# Altium footprint library lamp_controller.PcbLib: 67 footprints (part 2 of 5)
Each footprint in its own frame and in the unit in brackets; x right, y up, seen from the top. Pads: shape width x height; smd on the part's side, far side on the other; paste and mask are expansions set on the pad; w line width, h text height; cw(c..) or ccw(c..) is an arc to the next point about the centre after c.
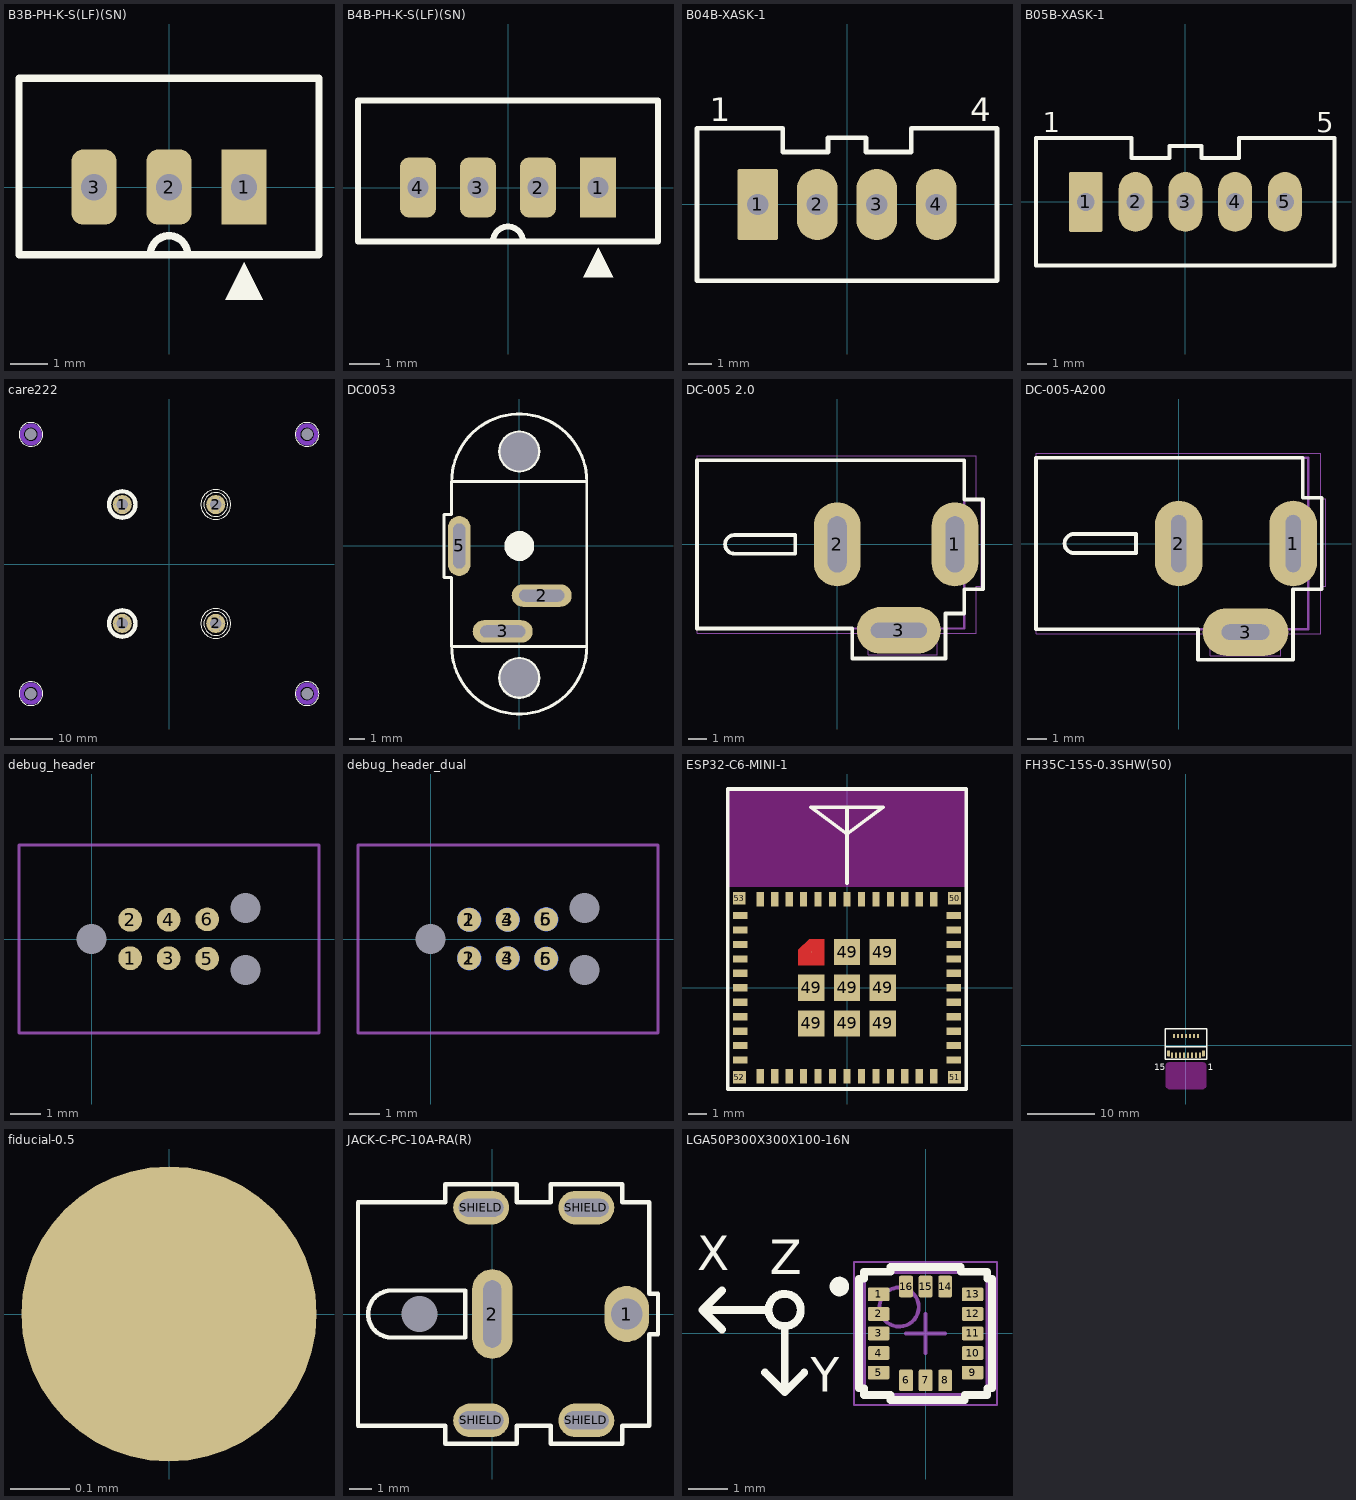
[diagram p1: the footprints below, top view; thin cyan lines are the x and y axes]

## B3B-PH-K-S(LF)(SN) [mm]
pads (3):
  rect 1.2x2 hole 0.7: 1(2,0)
  rrect50% 1.2x2 hole 0.7: 2(0,0) 3(-2,0)
Top Overlay:
  region: 1.5,-3 2.5,-3 2,-2
  lines w0.2: -0.5,-1.8 cw(c0,-1.8) 0.5,-1.8 ; -0.5,2.9 4,2.9 4,2.675 4,-1.575 4,-1.8 -4,-1.8 -4,2.9 0.5,2.9
3D body "B3B-PH-K--3DModel-STEP-56544.STEP": height 6, standoff -3.42, extent -3.975,-1.71 3.925,2.79

## B4B-PH-K-S(LF)(SN) [mm]
pads (4):
  rect 1.2x2 hole 0.7: 1(3,0)
  rrect50% 1.2x2 hole 0.7: 2(1,0) 3(-1,0) 4(-3,0)
Top Overlay:
  region: 2.5,-3 3.5,-3 3,-2
  lines w0.2: -0.5,-1.8 cw(c0,-1.8) 0.5,-1.8 ; -0.5,2.9 5,2.9 5,-1.8 -5,-1.8 -5,2.9 0.5,2.9
3D body "b4b-ph-k-s_connector.step": height 6.01, standoff -3.39, extent -4.95,-1.7 4.95,2.8

## B04B-XASK-1 [mm] "JST XA 2.5mm header"
pads (4):
  rrect10% 1.7x3 hole 0.9: 1(-3.75,0)
  oval 1.7x3 hole 0.9: 2(-1.25,0) 3(1.25,0) 4(3.75,0)
Top Overlay:
  lines w0.2: -6.3,-3.2 -6.3,3.2 -2.7,3.2 -2.7,2.2 -0.8,2.2 -0.8,2.8 0.8,2.8 0.8,2.2 2.7,2.2 2.7,3.2 6.3,3.2 6.3,-3.2 -6.3,-3.2
  text "4" at 5.167,3.5 h1
  text "1" at -5.767,3.5 h1
3D body "b04b-xask-1_connector.step": height 8.81, standoff -3.39, extent -6.25,-3.2 6.25,3.2

## B05B-XASK-1 [mm] "JST XA 2.5mm header"
pads (5):
  rrect10% 1.7x3 hole 0.9: 1(-5,0)
  oval 1.7x3 hole 0.9: 2(-2.5,0) 3(0,0) 4(2.5,0) 5(5,0)
Top Overlay:
  lines w0.2: -7.5,-3.2 7.5,-3.2 7.5,3.2 2.7,3.2 2.7,2.2 0.8,2.2 0.8,2.8 -0.8,2.8 -0.8,2.2 -2.7,2.2 -2.7,3.2 -7.5,3.2 -7.5,-3.2
  text "5" at 6.567,3.5 h1
  text "1" at -7.167,3.5 h1
3D body "b05b-xask-1_connector.step": height 8.81, standoff -3.39, extent -7.5,-3.2 7.5,3.2

## care222 [mm] "USHIO 222nm excimer emitter"
pads (8):
  round 4.5 hole 2.7 unplated mask+1.25: 1(-11,-14) 1(-11,14) 2(11,-14) 2(11,14)
  round 0 hole 2.7 unplated mask+1.25: ""(-32.5,-30.5) ""(-32.5,30.5) ""(32.5,-30.5) ""(32.5,30.5)
via -12.8,14 diameter 0.5 hole 0.3
via -11.9,15.559 diameter 0.5 hole 0.3
via -10.1,15.559 diameter 0.5 hole 0.3
via -9.2,14 diameter 0.5 hole 0.3
via -10.1,12.441 diameter 0.5 hole 0.3
via -11.9,12.441 diameter 0.5 hole 0.3
via 9.2,14 diameter 0.5 hole 0.3
via 10.1,15.559 diameter 0.5 hole 0.3
via 11.9,15.559 diameter 0.5 hole 0.3
via 12.8,14 diameter 0.5 hole 0.3
via 11.9,12.441 diameter 0.5 hole 0.3
via 10.1,12.441 diameter 0.5 hole 0.3
via 9.2,-14 diameter 0.5 hole 0.3
via 10.1,-12.441 diameter 0.5 hole 0.3
via 11.9,-12.441 diameter 0.5 hole 0.3
via 12.8,-14 diameter 0.5 hole 0.3
via 11.9,-15.559 diameter 0.5 hole 0.3
via 10.1,-15.559 diameter 0.5 hole 0.3
via -12.8,-14 diameter 0.5 hole 0.3
via -11.9,-12.441 diameter 0.5 hole 0.3
via -10.1,-12.441 diameter 0.5 hole 0.3
via -9.2,-14 diameter 0.5 hole 0.3
via -10.1,-15.559 diameter 0.5 hole 0.3
via -11.9,-15.559 diameter 0.5 hole 0.3
Top Layer keep-out:
  circle w1: c32.5,30.5 r2.1
  circle w1: c32.5,-30.5 r2.1
  circle w1: c-32.5,-30.5 r2.1
  circle w1: c-32.5,30.5 r2.1
Bottom Layer keep-out:
  circle w1: c32.5,30.5 r2.1
  circle w1: c32.5,-30.5 r2.1
  circle w1: c-32.5,-30.5 r2.1
  circle w1: c-32.5,30.5 r2.1
Top Overlay:
  circle w1: c-11,-14 r3.1
  circle w0.2: c11,14 r3.5
  circle w0.2: c11,-14 r3.5
  circle w0.2: c11,-14 r2.8
  circle w1: c-11,14 r3.1
  circle w0.2: c11,14 r2.8
  circle w0.2: c32.5,30.5 r2.8
  circle w0.2: c32.5,-30.5 r2.8
  circle w0.2: c-32.5,-30.5 r2.8
  circle w0.2: c-32.5,30.5 r2.8
3D body "ushio_care222_emitter2.sldprt": height 20.21, standoff 0.01, extent -48.5,-37.5 48.5,37.5

## DC0053 [mm] "5.5mm x 2 mm Barrel jack"
pads (5):
  oval 4x1.5 hole 0.8 slot 3 at 0 deg: 2(1.5,-3.3) 3(-1.1,-5.7)
  oval 1.5x4 hole 0.8 slot 3 at 90 deg: 5(-4,0)
  round 0 hole 2.5 unplated: ""(0,-8.8) ""(0,6.3)
Top Overlay:
  circle w1: c0,0 r0.5
  circle w0.2: c0,-8.8 r1.304
  circle w0.2: c0,6.3 r1.304
  lines w0.2: -4.5,-6.7 ccw(c0,-6.7) 4.5,-6.7 ; -4.5,-6.7 4.5,-6.7 ; -4.5,-6.7 -4.5,-2.1 -5,-2.1 -5,2.1 -4.5,2.1 -4.5,4.3 ; -4.5,4.3 cw(c0,4.3) 4.5,4.3 ; -4.5,4.3 4.5,4.3 ; 4.5,-6.7 4.5,4.3
3D body "dc0053_connector.step": height 11.91, standoff -4.49, extent -4.5,-11.2 4.5,8.8

## DC-005 2.0 [mm]
height 11
pads (3):
  oval 2.5x4.5 hole 1 slot 3 at 90 deg: 1(6.3,0) 2(0,0)
  oval 4.5x2.5 hole 0.8 slot 3 at 0 deg: 3(3.3,-4.6)
Top Overlay:
  lines w0.2: -5.5,-0.5 cw(c-5.5,0) -6,0 cw(c-5.5,0) -5.5,0.5 -2.25,0.5 -2.25,-0.5 -5.5,-0.5 ; -5.5,-0.5 -5.5,-0.5 ; -7.5,-4.5 -7.5,4.5 6.8,4.5 6.8,2.4 7.8,2.4 7.8,-2.4 6.8,-2.4 6.8,-3.7 5.8,-3.7 5.8,-6.1 0.8,-6.1 0.8,-4.5 -7.5,-4.5
Mechanical 1:
  lines w0: 0,-0.8 1,-0.8 1,0.8 0,0.8 0,-0.8 ; 2.7,-5.2 4.3,-5.2 4.3,-4.2 2.7,-4.2 2.7,-5.2 ; 6,-0.8 7,-0.8 7,0.8 6,0.8 6,-0.8
Mechanical 13:
  lines w0.127: -6.4,-4.5 6.8,-4.5 ; -6.4,4.5 6.8,4.5 ; 6.8,-4.5 6.8,4.5 ; 6.8,-4.5 -7.5,-4.5 -7.5,4.5 6.8,4.5
Mechanical 15:
  lines w0.05: -7.5,-4.75 1.65,-4.75 1.65,-5.9 5.35,-5.9 5.35,-4.75 7.45,-4.75 7.45,-2.25 7.7,-2.25 7.7,2.35 7.45,2.35 7.45,4.75 -7.5,4.75 -7.5,-4.75
3D body "dc-005_2.0_barrel_jack.sldprt": height 11.01, standoff -4.08, extent -7.5,-4.9 6.8,4.5

## DC-005-A200 [mm]
height 11
pads (3):
  oval 2.5x4.5 hole 0.8 slot 3 at 90 deg: 1(6,0) 2(0,0)
  oval 4.5x2.5 hole 0.8 slot 2.5 at 0 deg: 3(3.5,-4.65)
Top Overlay:
  lines w0.2: -5.5,-0.5 cw(c-5.5,0) -6,0 cw(c-5.5,0) -5.5,0.5 -2.25,0.5 -2.25,-0.5 -5.5,-0.5 ; -5.5,-0.5 -5.5,-0.5 ; -7.5,-4.5 1,-4.5 1,-6.1 6,-6.1 6,-3.7 6,-2.4 7.5,-2.4 7.5,2.4 6.5,2.4 6.5,4.5 -7.5,4.5 -7.5,-4.5
Mechanical 1:
  lines w0: 0,-0.8 0,0.8 1,0.8 1,-0.8 0,-0.8 ; 2.7,-5.2 2.7,-4.2 4.3,-4.2 4.3,-5.2 2.7,-5.2 ; 6,-0.8 6,0.8 7,0.8 7,-0.8 6,-0.8
Mechanical 13:
  lines w0.127: -6.4,-4.5 6.8,-4.5 ; -6.4,4.5 6.8,4.5 ; 6.8,-4.5 -7.5,-4.5 -7.5,4.5 6.8,4.5 ; 6.8,-4.5 6.8,4.5
Mechanical 15:
  lines w0.05: -7.5,-4.75 -7.5,4.75 7.45,4.75 7.45,2.35 7.7,2.35 7.7,-2.25 7.45,-2.25 7.45,-4.75 5.35,-4.75 5.35,-5.9 1.65,-5.9 1.65,-4.75 -7.5,-4.75
3D body "dc-005_a200_barrel_jack.sldprt": height 11.01, standoff -3.98, extent -7.5,-4.9 6.5,4.5

## debug_header [mm]
pads (9):
  round 0.787 smd paste-2: 1(1.27,-0.635) 2(1.27,0.635) 3(2.54,-0.635) 4(2.54,0.635) 5(3.81,-0.65) 6(3.81,0.65)
  round 0 hole 0.991 unplated: ""(0,0) ""(5.08,-1.016) ""(5.08,1.016)
Top Courtyard:
  lines w0.1: -2.4,-3.1 -2.4,3.1 7.5,3.1 7.5,-3.1 -2.4,-3.1

## debug_header_dual [mm]
pads (15):
  round 0.787 smd paste-2: 1(1.27,-0.635) 2(1.27,0.635) 3(2.54,-0.635) 4(2.54,0.635) 5(3.81,-0.65) 6(3.81,0.65)
  round 0.787 smd far side paste-2: 1(1.27,0.635) 2(1.27,-0.635) 3(2.54,0.635) 4(2.54,-0.635) 5(3.81,0.65) 6(3.81,-0.65)
  round 0 hole 0.991 unplated: ""(0,0) ""(5.08,-1.016) ""(5.08,1.016)
Top Courtyard:
  lines w0.1: -2.4,-3.1 -2.4,3.1 7.5,3.1 7.5,-3.1 -2.4,-3.1

## ESP32-C3-WROOM-02 [mm] "WiFi / Bluetooth module"

## ESP32-C6-MINI-1 [mm] "ESP32-C6-MINI-1 Wi-Fi Module"
height 2.4
pads (61):
  rect 0.8x0.4 smd: 1(-5.9,4) 2(-5.9,3.2) 3(-5.9,2.4) 4(-5.9,1.6) 5(-5.9,0.8) 6(-5.9,0) 7(-5.9,-0.8) 8(-5.9,-1.6) 9(-5.9,-2.4) 10(-5.9,-3.2) 11(-5.9,-4) 25(5.9,-4) 26(5.9,-3.2) 27(5.9,-2.4) 28(5.9,-1.6) 29(5.9,-0.8) 30(5.9,0) 31(5.9,0.8) 32(5.9,1.6) 33(5.9,2.4) 34(5.9,3.2) 35(5.9,4)
  rect 0.4x0.8 smd: 12(-4.8,-4.9) 13(-4,-4.9) 14(-3.2,-4.9) 15(-2.4,-4.9) 16(-1.6,-4.9) 17(-0.8,-4.9) 18(0,-4.9) 19(0.8,-4.9) 20(1.6,-4.9) 21(2.4,-4.9) 22(3.2,-4.9) 23(4,-4.9) 24(4.8,-4.9) 36(4.8,4.9) 37(4,4.9) 38(3.2,4.9) 39(2.4,4.9) 40(1.6,4.9) 41(0.8,4.9) 42(0,4.9) 43(-0.8,4.9) 44(-1.6,4.9) 45(-2.4,4.9) 46(-3.2,4.9) 47(-4,4.9) 48(-4.8,4.9)
  rect 1.45x1.45 smd: 49(-1.975,-1.975) 49(-1.975,0) 49(0,-1.975) 49(0,0) 49(0,1.975) 49(1.975,-1.975) 49(1.975,0) 49(1.975,1.975)
  round 0.025 smd paste+0 mask+0.102: 49(-1.975,1.975)
  rect 0.7x0.7 smd: 50(5.95,4.95) 51(5.95,-4.95) 52(-5.95,-4.95) 53(-5.955,4.95)
Top Layer:
  region: -2.7,1.25 -2.7,2.1 -2.1,2.7 -1.25,2.7 -1.25,1.25
Top Overlay:
  lines w0.2: 0,5.8 0,10 ; 0,10 -2,10 0,8.5 2,10 0,10 ; -6.6,-5.6 6.6,-5.6 6.6,11 -6.6,11 -6.6,-5.6
Keep-Out Layer:
  region: -6.6,11 6.6,11 6.6,5.6 -6.6,5.6
3D body "ESP32-C3-MINI-1 3D Model.STEP": height 2.4, standoff 0, extent -6.6,-5.6 6.6,11

## FH35C-15S-0.3SHW(50) [mm] "Flat flex connector"
pads (17):
  rrect50% 0.3x0.8 smd: 1(2.1,-1.475) 3(1.5,-1.475) 5(0.9,-1.475) 7(0.3,-1.475) 9(-0.3,-1.475) 11(-0.9,-1.475) 13(-1.5,-1.475) 15(-2.1,-1.475)
  rrect50% 0.3x0.65 smd: 2(1.8,1.4) 4(1.2,1.4) 6(0.6,1.4) 8(0,1.4) 10(-0.6,1.4) 12(-1.2,1.4) 14(-1.8,1.4)
  rrect50% 0.4x0.95 smd: MP(-2.6,-1.2) MP(2.6,-1.2)
Top Overlay:
  lines w0.2: -3.1,-0.2 3.1,-0.2 ; -3.1,-2.1 -3.1,2.5 3.1,2.5 3.1,-2.1 -3.1,-2.1
  text "1" at 3.233,-3.7 h1
  text "15" at -4.75,-3.7 h1
Bottom Overlay:
  lines w0.2: -2.5,22.91 2.5,22.91 ; 0,20.41 0,25.41 ; -15.76,4.5 -15.76,38.22 15.76,38.22 15.76,4.5 -15.76,4.5 ; -13.86,9.05 13.86,9.05 13.86,36.77 -13.86,36.77 -13.86,9.05
Keep-Out Layer:
  board cut-out: -3,-6 -3,-3 -3,-2.901 -2.924,-2.717 -2.783,-2.576 -2.599,-2.5 -2.5,-2.5 2.5,-2.5 2.599,-2.5 2.783,-2.576 2.924,-2.717 3,-2.901 3,-3 3,-6 3,-6.099 2.924,-6.283 2.783,-6.424 2.599,-6.5 2.5,-6.5 -2.5,-6.5 -2.599,-6.5 -2.783,-6.424 -2.924,-6.283 -3,-6.099
3D body "fh35-15s-0.3shw(50)_connector.step": height 0.91, standoff 0.01, extent -3.05,-1.75 3.05,2.45
3D body "er-tft1.54-2_lcd_bend1.sldprt": height 1.91, standoff -0.4, extent -15.76,-3.651 15.76,38.22

## fiducial-0.5 [mm] "0.5mm diameter fiducial"
pads (1):
  round 0.5 smd paste-1 mask+0.5: ""(0,0)

## JACK-C-PC-10A-RA(R) [mm] "5.5mm x 2.1mm right angle barrel jack"
pads (7):
  oval 2x2.5 / inner oval 2.2x3 / far side oval 2.2x3 hole 1.4: 1(6,0)
  oval 1.8x4 / inner oval 2x4 / far side oval 2x4 hole 0.8 slot 3 at 90 deg: 2(0,0)
  oval 2.5x1.5 / inner oval 3x2 / far side oval 3x2 hole 0.8 slot 2 at 0 deg: SHIELD(-0.5,-4.75) SHIELD(-0.5,4.75) SHIELD(4.2,-4.75) SHIELD(4.2,4.75)
  round 0 hole 1.6 unplated: ""(-3.25,0)
Top Overlay:
  lines w0.2: -6,-5 -2.1,-5 -2.1,-5.8 1.1,-5.8 1.1,-5 2.6,-5 2.6,-5.8 5.8,-5.8 5.8,-5 7,-5 7,-0.9 7.4,-0.9 7.4,0.9 7,0.9 7,5 5.8,5 5.8,5.8 2.6,5.8 2.6,5 1.1,5 1.1,5.8 -2.1,5.8 -2.1,5 -6,5 -6,-5 ; -4.5,-1.05 cw(c-4.5,0) -4.5,1.05 -1.2,1.05 -1.2,-1.05 -4.5,-1.05
3D body "jack-c-pc-10a-ra(r)_barrel_jack.step": height 10.01, standoff -2.19, extent -6,-5 7,5

## LGA50P300X300X100-16N [mm] "LGA, 16-Leads, Body 3.00x3.00mm, Pitch 0.50mm, IPC Medium Density"
height 1
pads (16):
  rrect20% 0.55x0.35 smd: 1(-1.2,1) 2(-1.2,0.5) 3(-1.2,0) 4(-1.2,-0.5) 5(-1.2,-1) 9(1.2,-1) 10(1.2,-0.5) 11(1.2,0) 12(1.2,0.5) 13(1.2,1)
  rrect20% 0.35x0.55 smd: 6(-0.5,-1.2) 7(0,-1.2) 8(0.5,-1.2) 14(0.5,1.2) 15(0,1.2) 16(-0.5,1.2)
Top Overlay:
  circle w0.2: c-3.6,0.6 r0.412
  circle w0.25: c-2.2,1.2 r0.125
  lines w0.2: -5.2,0.1 -5.7,0.6 ; -5.2,1.1 -5.7,0.6 ; -4.1,-1 -3.6,-1.5 ; -4.1,0.6 -5.7,0.6 ; -3.6,0.1 -3.6,-1.5 ; -3.1,-1 -3.6,-1.5 ; -1.7,-1.4 -1.7,1.4 -1.575,1.4 -1.575,1.575 -0.9,1.575 -0.9,1.7 0.9,1.7 0.9,1.575 1.575,1.575 1.575,1.4 1.7,1.4 1.7,-1.4 1.575,-1.4 1.575,-1.575 1,-1.575 1,-1.7 -0.9,-1.7 -0.9,-1.575 -1.575,-1.575 -1.575,-1.4 -1.7,-1.4
  text "Z" at -3.979,1.22 h1.5
  text "X" at -5.84,1.32 h1.5
  text "Y" at -2.939,-1.78 h1.5
Mechanical 13:
  circle w0.1: c-0.675,0.675 r0.5
  lines w0.1: -1.575,-1.575 -1.575,1.575 1.575,1.575 1.575,-1.575 -1.575,-1.575
Mechanical 15:
  lines w0.05: -1.825,-1.825 -1.825,1.825 1.825,1.825 1.825,-1.825 -1.825,-1.825
  lines w0.1: -0.5,0 0.5,0 ; 0,-0.5 0,0.5
3D body "LGA50P300X300X100-16N.step": height 1, standoff 0, extent -1.575,-1.575 1.575,1.575